# Altium footprint library 7-Connectors-13.PcbLib: 44 footprints (part 3 of 5)
Each footprint in its own frame and in the unit in brackets; x right, y up, seen from the top. Pads: shape width x height; smd on the part's side, far side on the other; paste and mask are expansions set on the pad; w line width, h text height; cw(c..) or ccw(c..) is an arc to the next point about the centre after c.
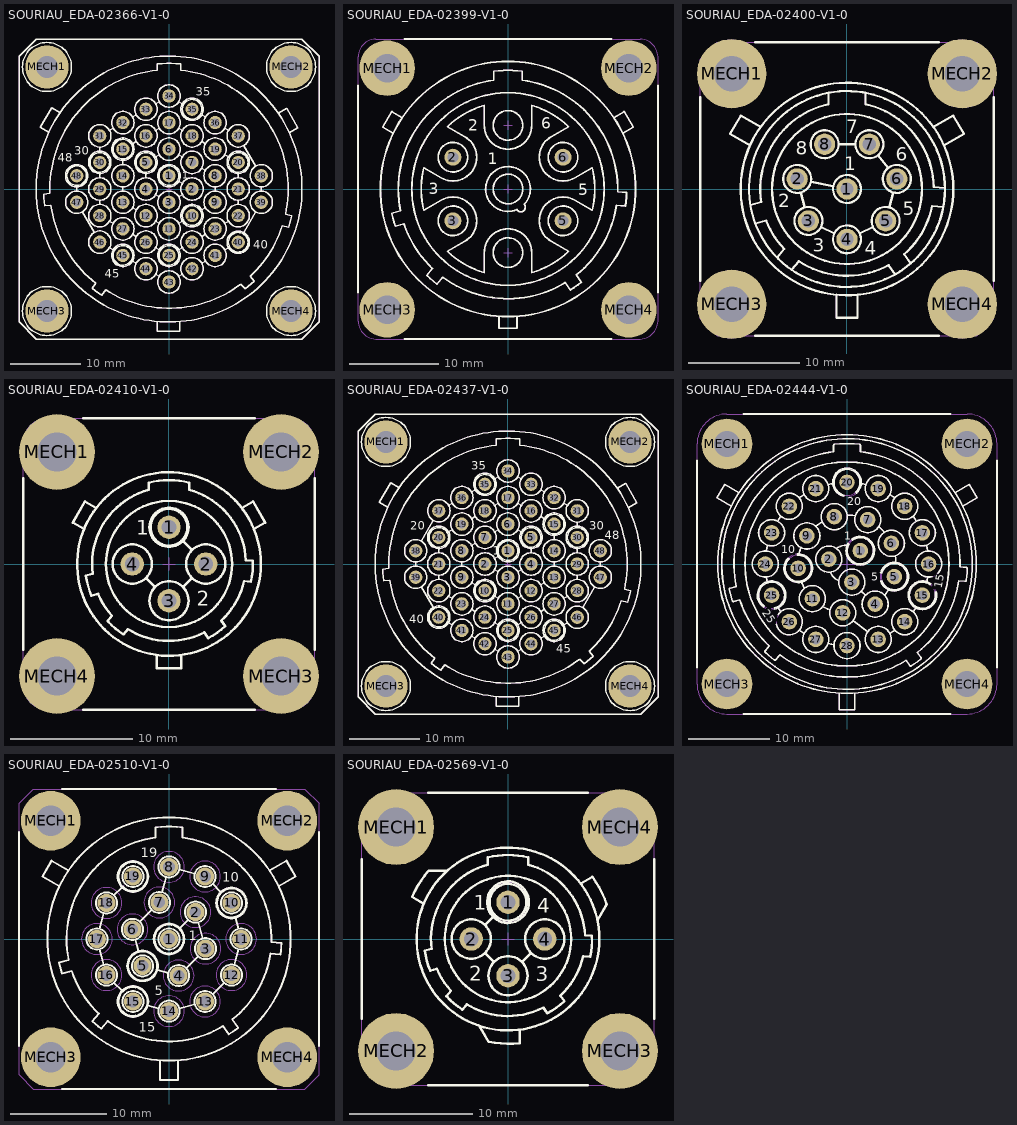
[diagram p2: the footprints below, top view; thin cyan lines are the x and y axes]

## SOURIAU_EDA-02366-V1-0 [mm] "Adapter Kit For PCB Mount For SOURIAU UTO02448P21T, 48 Poles, Shell Size 24, UT Bantam Circular Male Connector. UTO Series"
height 37.7
pads (52):
  round 1.9 hole 1.2: 1(0,1.9) 2(3.3,0) 3(0,-1.9) 4(-3.3,0) 5(-3.3,3.8) 6(0,5.7) 7(3.3,3.8) 8(6.6,1.9) 9(6.6,-1.9) 10(3.3,-3.8) 11(0,-5.7) 12(-3.3,-3.8) 13(-6.6,-1.9) 14(-6.6,1.883) 15(-6.6,5.7) 16(-3.3,7.6) 17(0,9.5) 18(3.3,7.6) 19(6.6,5.7) 20(9.9,3.8) 21(9.9,0) 22(9.9,-3.8) 23(6.6,-5.7) 24(3.3,-7.6) 25(0,-9.5) 26(-3.3,-7.6) 27(-6.6,-5.7) 28(-9.9,-3.8) 29(-9.9,0) 30(-9.9,3.8) 31(-9.9,7.6) 32(-6.6,9.5) 33(-3.3,11.4) 34(0,13.3) 35(3.3,11.4) 36(6.6,9.5) 37(9.9,7.6) 38(13.2,1.9) 39(13.2,-1.9) 40(9.9,-7.617) 41(6.6,-9.5) 42(3.3,-11.4) 43(0,-13.3) 44(-3.3,-11.4) 45(-6.6,-9.5) 46(-9.9,-7.6) 47(-13.2,-1.9) 48(-13.2,1.9)
  round 6.2 hole 3.2: MECH1(-17.45,17.45) MECH2(17.45,17.45) MECH3(-17.45,-17.45) MECH4(17.45,-17.45)
Top Overlay:
  circle w0.2: c6.6,9.5 r1.6
  circle w0.2: c9.9,7.6 r1.6
  circle w0.2: c6.6,5.7 r1.6
  circle w0.2: c3.3,7.6 r1.6
  circle w0.2: c0,9.5 r1.6
  circle w0.2: c0,13.3 r1.6
  circle w0.2: c-3.3,11.4 r1.6
  circle w0.2: c-6.6,9.5 r1.6
  circle w0.2: c-3.3,7.6 r1.6
  circle w0.2: c0,5.7 r1.6
  circle w0.2: c3.3,3.8 r1.6
  circle w0.2: c13.2,1.9 r1.6
  circle w0.2: c9.9,0 r1.6
  circle w0.2: c6.6,1.9 r1.6
  circle w0.2: c13.2,-1.9 r1.6
  circle w0.2: c9.9,-3.8 r1.6
  circle w0.2: c6.6,-1.9 r1.6
  circle w0.2: c6.6,-5.7 r1.6
  circle w0.2: c6.6,-9.5 r1.6
  circle w0.2: c3.3,-7.6 r1.6
  circle w0.2: c0,-5.7 r1.6
  circle w0.2: c0,-1.9 r1.6
  circle w0.2: c3.3,0 r1.6
  circle w0.2: c-3.3,0 r1.6
  circle w0.2: c-9.9,7.6 r1.6
  circle w0.2: c-9.9,0 r1.6
  circle w0.2: c-6.6,1.883 r1.6
  circle w0.2: c-6.6,-1.9 r1.6
  circle w0.2: c-13.2,-1.9 r1.6
  circle w0.2: c-9.9,-3.8 r1.6
  circle w0.2: c-6.6,-5.7 r1.6
  circle w0.2: c-3.3,-3.8 r1.6
  circle w0.2: c-3.3,-7.6 r1.6
  circle w0.2: c0,-13.3 r1.6
  circle w0.2: c3.3,-11.4 r1.6
  circle w0.2: c-3.3,-11.4 r1.6
  circle w0.2: c-9.9,-7.6 r1.6
  circle w0.2: c-3.3,3.8 r1.4
  circle w0.2: c0,0 r19.015
  circle w0.2: c-17.45,17.45 r3.5
  circle w0.2: c17.45,17.45 r3.5
  circle w0.2: c17.45,-17.45 r3.5
  circle w0.2: c-17.45,-17.45 r3.5
  circle w0.2: c3.3,11.4 r1.6
  circle w0.2: c9.9,3.8 r1.6
  circle w0.2: c9.9,-7.617 r1.6
  circle w0.2: c3.3,-3.8 r1.6
  circle w0.2: c0,1.9 r1.6
  circle w0.2: c-3.3,3.8 r1.6
  circle w0.2: c-6.6,5.7 r1.6
  circle w0.2: c-9.9,3.8 r1.6
  circle w0.2: c-13.2,1.9 r1.6
  circle w0.2: c0,-9.5 r1.6
  circle w0.2: c-6.6,-9.5 r1.6
  circle w0.2: c-6.6,5.7 r1.4
  circle w0.2: c-9.9,3.8 r1.4
  circle w0.2: c-13.2,1.9 r1.4
  circle w0.2: c0,1.9 r1.4
  circle w0.2: c3.3,-3.8 r1.4
  circle w0.2: c9.9,-7.617 r1.4
  circle w0.2: c9.9,3.8 r1.4
  circle w0.2: c3.3,11.4 r1.4
  circle w0.2: c0,-9.5 r1.4
  circle w0.2: c-6.6,-9.5 r1.4
  lines w0.2: -17.187,8.134 -18.394,8.831 -16.794,11.602 -15.58,10.901 ; -13.2,-0.3 -13.2,0.3 ; -12.398,-3.285 -10.702,-6.215 ; -9.9,-2.2 -9.9,-1.6 ; -9.9,1.6 -9.9,2.2 ; -9.9,5.4 -9.9,6 ; -8.513,-8.398 -7.987,-8.702 ; -8.513,-4.598 -7.987,-4.902 ; -8.513,8.398 -7.987,8.702 ; -6.6,-0.3 -6.6,0.283 ; -6.6,3.483 -6.6,4.1 ; -5.213,-10.298 -4.687,-10.602 ; -5.213,-6.498 -4.687,-6.802 ; -5.213,-2.698 -4.687,-3.002 ; -5.213,6.498 -4.687,6.802 ; -5.213,10.298 -4.687,10.602 ; -3.3,1.6 -3.3,2.2 ; -1.913,-12.198 -1.387,-12.502 ; -1.913,-8.398 -1.387,-8.702 ; -1.913,-4.598 -1.387,-4.902 ; -1.913,-0.798 -1.387,-1.102 ; -1.913,4.598 -1.387,4.902 ; -1.913,8.398 -1.387,8.702 ; -1.913,12.198 -1.387,12.502 ; -1.651,-18.943 -1.651,-20.345 1.549,-20.345 1.549,-18.952 ; 1.387,-12.502 1.913,-12.198 ; 1.387,-8.702 1.913,-8.398 ; 1.387,-4.902 1.913,-4.598 ; 1.387,-1.102 1.913,-0.798 ; 1.387,1.102 1.913,0.798 ; 1.387,4.902 1.913,4.598 ; 1.387,8.702 1.913,8.398 ; 1.387,12.502 1.913,12.198 ; 4.687,-10.602 5.213,-10.298 ; 4.687,-6.802 5.213,-6.498 ; 4.687,-3.002 5.213,-2.698 ; 4.687,3.002 5.213,2.698 ; 4.687,6.802 5.213,6.498 ; 4.687,10.602 5.213,10.298 ; 6.6,-0.3 6.6,0.3 ; 7.987,-4.902 8.513,-4.598 ; 7.987,4.902 8.513,4.598 ; 7.987,8.702 8.513,8.398 ; 7.99,-8.707 8.51,-8.41 ; 9.9,-2.2 9.9,-1.6 ; 9.9,1.6 9.9,2.2 ; 10.7,-6.231 12.4,-3.286 ; 10.702,6.215 12.398,3.285 ; 13.2,-0.3 13.2,0.3 ; 15.638,10.818 16.845,11.514 18.445,8.743 17.231,8.042 ; -21.45,-18.95 -18.95,-21.45 18.95,-21.45 21.45,-18.95 21.45,18.95 18.95,21.45 -18.95,21.45 -21.45,18.95 -21.45,-18.95 ; -17.946,-0.719 ccw(c0,0) -17.798,-2.41 -16.885,-2.33 ccw(c0,0) -10.461,-13.458 -10.986,-14.208 ccw(c0,0) -9.594,-15.183 -9.068,-14.433 ccw(c0,0) 10.292,-13.587 10.88,-14.289 ccw(c0,0) 12.183,-13.196 11.594,-12.495 ccw(c0,0) 16.224,-5.227 17.109,-5.464 ccw(c0,0) 17.549,-3.822 16.664,-3.585 ccw(c0,0) 1.65,16.965 1.65,17.884 ccw(c0,0) -1.65,17.884 -1.65,16.965 ccw(c0,0) -17.033,-0.637 -17.946,-0.719
  text "45" at -9.186,-12.664 h1.2
  text "40" at 12.075,-8.522 h1.2
  text "35" at 3.817,13.325 h1.2
  text "1" at 1.875,1.45 h1
  text "30" at -13.527,4.91 h1.2
  text "48" at -15.88,3.889 h1.2
Mechanical 8:
  drawing of 212 lines, arcs and shapes, not listed
Mechanical 14:
  circle w0.1: c0,0 r19.015
  circle w0.1: c-17.45,17.45 r2.75
  circle w0.1: c17.45,17.45 r2.75
  circle w0.1: c17.45,-17.45 r2.75
  circle w0.1: c-17.45,-17.45 r2.75
  circle w0.1: c3.3,11.4 r1.6
  circle w0.1: c6.6,9.5 r1.6
  circle w0.1: c9.9,7.6 r1.6
  circle w0.1: c6.6,5.7 r1.6
  circle w0.1: c3.3,7.6 r1.6
  circle w0.1: c0,9.5 r1.6
  circle w0.1: c0,13.3 r1.6
  circle w0.1: c-3.3,11.4 r1.6
  circle w0.1: c-6.6,9.5 r1.6
  circle w0.1: c-3.3,7.6 r1.6
  circle w0.1: c0,5.7 r1.6
  circle w0.1: c3.3,3.8 r1.6
  circle w0.1: c9.9,3.8 r1.6
  circle w0.1: c13.2,1.9 r1.6
  circle w0.1: c9.9,0 r1.6
  circle w0.1: c6.6,1.9 r1.6
  circle w0.1: c13.2,-1.9 r1.6
  circle w0.1: c9.9,-3.8 r1.6
  circle w0.1: c6.6,-1.9 r1.6
  circle w0.1: c6.6,-5.7 r1.6
  circle w0.1: c9.9,-7.617 r1.6
  circle w0.1: c6.6,-9.5 r1.6
  circle w0.1: c3.3,-7.6 r1.6
  circle w0.1: c0,-5.7 r1.6
  circle w0.1: c3.3,-3.8 r1.6
  circle w0.1: c0,-1.9 r1.6
  circle w0.1: c0,1.9 r1.6
  circle w0.1: c3.3,0 r1.6
  circle w0.1: c-3.3,0 r1.6
  circle w0.1: c-3.3,3.8 r1.6
  circle w0.1: c-6.6,5.7 r1.6
  circle w0.1: c-9.9,7.6 r1.6
  circle w0.1: c-9.9,3.8 r1.6
  circle w0.1: c-13.2,1.9 r1.6
  circle w0.1: c-9.9,0 r1.6
  circle w0.1: c-6.6,1.883 r1.6
  circle w0.1: c-6.6,-1.9 r1.6
  circle w0.1: c-13.2,-1.9 r1.6
  circle w0.1: c-9.9,-3.8 r1.6
  circle w0.1: c-6.6,-5.7 r1.6
  circle w0.1: c-3.3,-3.8 r1.6
  circle w0.1: c-3.3,-7.6 r1.6
  circle w0.1: c0,-9.5 r1.6
  circle w0.1: c0,-13.3 r1.6
  circle w0.1: c3.3,-11.4 r1.6
  circle w0.1: c-3.3,-11.4 r1.6
  circle w0.1: c-6.6,-9.5 r1.6
  circle w0.1: c-9.9,-7.6 r1.6
  lines w0.1: -17.187,8.134 -18.394,8.831 -16.794,11.602 -15.58,10.901 ; -13.2,-0.3 -13.2,0.3 ; -12.398,-3.285 -10.702,-6.215 ; -9.9,-2.2 -9.9,-1.6 ; -9.9,1.6 -9.9,2.2 ; -9.9,5.4 -9.9,6 ; -8.513,-8.398 -7.987,-8.702 ; -8.513,-4.598 -7.987,-4.902 ; -8.513,8.398 -7.987,8.702 ; -6.6,-0.3 -6.6,0.283 ; -6.6,3.483 -6.6,4.1 ; -5.213,-10.298 -4.687,-10.602 ; -5.213,-6.498 -4.687,-6.802 ; -5.213,-2.698 -4.687,-3.002 ; -5.213,6.498 -4.687,6.802 ; -5.213,10.298 -4.687,10.602 ; -3.3,1.6 -3.3,2.2 ; -1.913,-12.198 -1.387,-12.502 ; -1.913,-8.398 -1.387,-8.702 ; -1.913,-4.598 -1.387,-4.902 ; -1.913,-0.798 -1.387,-1.102 ; -1.913,4.598 -1.387,4.902 ; -1.913,8.398 -1.387,8.702 ; -1.913,12.198 -1.387,12.502 ; -1.651,-18.943 -1.651,-20.345 1.549,-20.345 1.549,-18.952 ; 1.387,-12.502 1.913,-12.198 ; 1.387,-8.702 1.913,-8.398 ; 1.387,-4.902 1.913,-4.598 ; 1.387,-1.102 1.913,-0.798 ; 1.387,1.102 1.913,0.798 ; 1.387,4.902 1.913,4.598 ; 1.387,8.702 1.913,8.398 ; 1.387,12.502 1.913,12.198 ; 4.687,-10.602 5.213,-10.298 ; 4.687,-6.802 5.213,-6.498 ; 4.687,-3.002 5.213,-2.698 ; 4.687,3.002 5.213,2.698 ; 4.687,6.802 5.213,6.498 ; 4.687,10.602 5.213,10.298 ; 6.6,-0.3 6.6,0.3 ; 7.987,-4.902 8.513,-4.598 ; 7.987,4.902 8.513,4.598 ; 7.987,8.702 8.513,8.398 ; 7.99,-8.707 8.51,-8.41 ; 9.9,-2.2 9.9,-1.6 ; 9.9,1.6 9.9,2.2 ; 10.7,-6.231 12.4,-3.286 ; 10.702,6.215 12.398,3.285 ; 13.2,-0.3 13.2,0.3 ; 15.638,10.818 16.845,11.514 18.445,8.743 17.231,8.042 ; -21.45,-18.95 -18.95,-21.45 18.95,-21.45 21.45,-18.95 21.45,18.95 18.95,21.45 -18.95,21.45 -21.45,18.95 -21.45,-18.95 ; -17.946,-0.719 ccw(c0,0) -17.798,-2.41 -16.885,-2.33 ccw(c0,0) -10.461,-13.458 -10.986,-14.208 ccw(c0,0) -9.594,-15.183 -9.068,-14.433 ccw(c0,0) 10.292,-13.587 10.88,-14.289 ccw(c0,0) 12.183,-13.196 11.594,-12.495 ccw(c0,0) 16.224,-5.227 17.109,-5.464 ccw(c0,0) 17.549,-3.822 16.664,-3.585 ccw(c0,0) 1.65,16.965 1.65,17.884 ccw(c0,0) -1.65,17.884 -1.65,16.965 ccw(c0,0) -17.033,-0.637 -17.946,-0.719
  text "45" at -7.571,-10.1 h1.2
  text "40" at 8.929,-8.217 h1.2
  text "35" at 2.329,10.8 h1.2
  text "25" at -0.971,-10.1 h1.2
  text "20" at 8.929,3.2 h1.2
  text "15" at -7.457,5.1 h1.2
  text "10" at 2.443,-4.4 h1.2
  text "5" at -3.7,3.2 h1.2
  text "1" at -0.143,1.3 h1.2
  text "30" at -10.871,3.2 h1.2
  text "48" at -14.171,1.3 h1.2
3D body "EDA-02366-V1-0.stp": height 37.7, standoff -11.1, extent -21.45,-21.45 21.45,21.45

## SOURIAU_EDA-02399-V1-0 [mm] "Adapter Kit For PCB Mount For SOURIAU UTG0187SVDEX, 8 Poles,VDE  Metalok Bantam Circular Female Connecteur"
height 40.45
pads (8):
  round 1.9 hole 1.2: 2(-6.149,3.55) 3(-6.149,-3.55) 5(6.149,-3.55) 6(6.149,3.55)
  round 6.2 hole 3.2: MECH1(-13.5,13.5) MECH2(13.5,13.5) MECH3(-13.5,-13.5) MECH4(13.5,-13.5)
Top Overlay:
  circle w0.2: c0,0 r14.25
  circle w0.2: c0,0 r10.75
  circle w0.2: c6.149,-3.55 r1.65
  circle w0.2: c0,-7.1 r1.65
  circle w0.2: c-6.149,-3.55 r1.65
  circle w0.2: c0,0 r1.65
  circle w0.2: c-6.149,3.55 r1.65
  circle w0.2: c0,7.1 r1.65
  circle w0.2: c6.149,3.55 r1.65
  lines w0.2: -16.75,-11.594 -16.75,11.594 ; -12.81,6.241 -13.967,6.909 -12.967,8.641 -11.81,7.973 ; -11.594,-16.75 11.594,-16.75 ; -11.594,16.75 11.594,16.75 ; -1,-14.215 -1,-15.55 1,-15.55 1,-14.215 ; 11.81,7.973 12.967,8.641 13.967,6.909 12.81,6.241 ; 16.75,-11.594 16.75,11.594 ; -12.972,-2.699 ccw(c0,0) -12.584,-4.148 -11.616,-3.889 ccw(c0,0) -8.434,-8.884 -9.078,-9.652 ccw(c0,0) -7.929,-10.616 -7.285,-9.849 ccw(c0,0) 6.399,-10.446 6.973,-11.267 ccw(c0,0) 8.202,-10.406 7.627,-9.586 ccw(c0,0) 12.115,-1.813 13.113,-1.9 ccw(c0,0) 13.244,-0.406 12.246,-0.319 ccw(c0,0) 1.6,12.145 1.6,13.153 ccw(c0,0) -1.6,13.153 -1.6,12.145 ccw(c0,0) -12.005,-2.44 -12.972,-2.699 ; -9.406,-2.371 cw(c0,0) -9.406,2.371 -7.474,1.255 ccw(c-6.149,3.55) -4.824,5.845 -6.756,6.96 cw(c0,0) -2.65,9.331 -2.65,7.1 ccw(c0,7.1) 2.65,7.1 2.65,9.331 cw(c0,0) 6.756,6.96 4.824,5.845 ccw(c6.149,3.55) 7.474,1.255 9.406,2.371 cw(c0,0) 9.406,-2.371 7.474,-1.255 ccw(c6.149,-3.55) 4.824,-5.845 6.756,-6.96 cw(c0,0) 2.65,-9.331 2.65,-7.1 ccw(c0,-7.1) -2.65,-7.1 -2.65,-9.331 cw(c0,0) -6.756,-6.96 -4.824,-5.845 ccw(c-6.149,-3.55) -7.474,-1.255 -9.406,-2.371 ; 0.998,-2.292 cw(c0,0) 1.813,-1.722 cw(c1.434,-2.048) 0.998,-2.292
  text "6" at 3.709,6.718 h1.25
  text "5" at 7.859,-0.682 h1.25
  text "3" at -8.841,-0.582 h1.25
  text "2" at -4.416,6.518 h1.25
  text "1" at -2.242,2.768 h1.25
Mechanical 8:
  lines w0.1: -14,-13.5 -13.5,-13.5 ; -14,13.5 -13.5,13.5 ; -13.5,-14 -13.5,-13.5 ; -13.5,-13 -13.5,-13.5 ; -13.5,13 -13.5,13.5 ; -13.5,14 -13.5,13.5 ; -13,-13.5 -13.5,-13.5 ; -13,13.5 -13.5,13.5 ; -6.582,-3.8 -6.149,-3.55 ; -6.582,3.8 -6.149,3.55 ; -6.399,-3.117 -6.149,-3.55 ; -6.399,3.117 -6.149,3.55 ; -5.899,-3.983 -6.149,-3.55 ; -5.899,3.983 -6.149,3.55 ; -5.716,-3.3 -6.149,-3.55 ; -5.716,3.3 -6.149,3.55 ; -0.5,-7.1 0,-7.1 ; -0.5,0 0,0 ; -0.5,7.1 0,7.1 ; 0,-7.6 0,-7.1 ; 0,-6.6 0,-7.1 ; 0,-0.5 0,0 ; 0,0.5 0,0 ; 0,6.6 0,7.1 ; 0,7.6 0,7.1 ; 0.5,-7.1 0,-7.1 ; 0.5,0 0,0 ; 0.5,7.1 0,7.1 ; 5.716,-3.3 6.149,-3.55 ; 5.716,3.3 6.149,3.55 ; 5.899,-3.983 6.149,-3.55 ; 5.899,3.983 6.149,3.55 ; 6.399,-3.117 6.149,-3.55 ; 6.399,3.117 6.149,3.55 ; 6.582,-3.8 6.149,-3.55 ; 6.582,3.8 6.149,3.55 ; 13,-13.5 13.5,-13.5 ; 13,13.5 13.5,13.5 ; 13.5,-14 13.5,-13.5 ; 13.5,-13 13.5,-13.5 ; 13.5,13 13.5,13.5 ; 13.5,14 13.5,13.5 ; 14,-13.5 13.5,-13.5 ; 14,13.5 13.5,13.5
Mechanical 14:
  circle w0.1: c6.149,-3.55 r1.65
  circle w0.1: c6.149,3.55 r1.65
  circle w0.1: c0,-7.1 r1.65
  circle w0.1: c-6.149,-3.55 r1.65
  circle w0.1: c-6.149,3.55 r1.65
  circle w0.1: c0,7.1 r1.65
  circle w0.1: c-13.5,-13.5 r1.6
  circle w0.1: c13.5,-13.5 r1.6
  circle w0.1: c13.5,13.5 r1.6
  circle w0.1: c-13.5,13.5 r1.6
  circle w0.1: c0,0 r1.65
  circle w0.1: c0,0 r10.75
  circle w0.1: c0,0 r14.25
  lines w0.1: -12.81,6.241 -13.967,6.909 -12.967,8.641 -11.81,7.973 ; -1,-14.215 -1,-15.55 1,-15.55 1,-14.215 ; 11.81,7.973 12.967,8.641 13.967,6.909 12.81,6.241 ; -16.75,-14.75 ccw(c-14.75,-14.75) -14.75,-16.75 14.75,-16.75 ccw(c14.75,-14.75) 16.75,-14.75 16.75,14.75 ccw(c14.75,14.75) 14.75,16.75 -14.75,16.75 ccw(c-14.75,14.75) -16.75,14.75 -16.75,-14.75 ; -12.972,-2.699 ccw(c0,0) -12.584,-4.148 -11.616,-3.889 ccw(c0,0) -8.434,-8.884 -9.078,-9.652 ccw(c0,0) -7.929,-10.616 -7.285,-9.849 ccw(c0,0) 6.399,-10.446 6.973,-11.267 ccw(c0,0) 8.202,-10.406 7.627,-9.586 ccw(c0,0) 12.115,-1.813 13.113,-1.9 ccw(c0,0) 13.244,-0.406 12.246,-0.319 ccw(c0,0) 1.6,12.145 1.6,13.153 ccw(c0,0) -1.6,13.153 -1.6,12.145 ccw(c0,0) -12.005,-2.44 -12.972,-2.699 ; -9.406,-2.371 cw(c0,0) -9.406,2.371 -7.474,1.255 ccw(c-6.149,3.55) -4.824,5.845 -6.756,6.96 cw(c0,0) -2.65,9.331 -2.65,7.1 ccw(c0,7.1) 2.65,7.1 2.65,9.331 cw(c0,0) 6.756,6.96 4.824,5.845 ccw(c6.149,3.55) 7.474,1.255 9.406,2.371 cw(c0,0) 9.406,-2.371 7.474,-1.255 ccw(c6.149,-3.55) 4.824,-5.845 6.756,-6.96 cw(c0,0) 2.65,-9.331 2.65,-7.1 ccw(c0,-7.1) -2.65,-7.1 -2.65,-9.331 cw(c0,0) -6.756,-6.96 -4.824,-5.845 ccw(c-6.149,-3.55) -7.474,-1.255 -9.406,-2.371 ; 0.998,-2.292 ccw(c1.434,-2.048) 1.813,-1.722 ccw(c0,0) 0.998,-2.292
  text "2" at -6.815,2.55 h2
  text "3" at -6.815,-4.55 h2
  text "5" at 5.482,-4.55 h2
  text "6" at 5.53,2.55 h2
  text "X" at -0.667,-1 h2
  text "X" at -0.667,6.1 h2
  text "X" at -0.667,-8.1 h2
3D body "EDA-02399-V1-0.stp": height 40.3, standoff -5.89, extent -16.75,-16.75 16.75,16.75

## SOURIAU_EDA-02400-V1-0 [mm] "Adapter Kit For PCB Mount For SOURIAU UTG0128S03, 8 Poles, Shell Size 12, Metalok Bantam Circular Female Connecteur"
height 33.95
pads (12):
  round 1.9 hole 1.2: 1(0,0) 2(-4.45,0.9) 3(-3.45,-2.85) 4(0,-4.5) 5(3.45,-2.85) 6(4.45,0.9) 7(2,4) 8(-2,4)
  round 6.2 hole 3.2: MECH1(-10.3,10.3) MECH2(10.3,10.3) MECH3(-10.3,-10.3) MECH4(10.3,-10.3)
Top Overlay:
  circle w0.2: c0,0 r9.5
  circle w0.2: c0,0 r9.5
  circle w0.2: c0,0 r6.7
  circle w0.2: c0,0 r8.75
  circle w0.2: c-4.45,0.9 r1.25
  circle w0.2: c-2,4 r1.25
  circle w0.2: c2,4 r1.25
  circle w0.2: c4.45,0.9 r1.25
  circle w0.2: c3.45,-2.85 r1.25
  circle w0.2: c0,-4.5 r1.25
  circle w0.2: c-3.45,-2.85 r1.25
  circle w0.2: c0,0 r1.25
  lines w0.2: -13.1,-8.2 -13.1,8.2 ; -8.659,3.908 -10.432,4.932 -9.487,6.568 -7.714,5.545 ; -8.632,-1.433 -7.661,-1.173 cw(c0,0) -1.65,7.572 -1.65,8.593 ; -8.2,-13.1 8.2,-13.1 ; -8.2,13.1 8.2,13.1 ; -8.192,-3.075 -7.221,-2.815 ccw(c0,0) -5.603,-5.355 -6.249,-6.125 ; -4.947,-7.218 -4.3,-6.447 ccw(c0,0) 3.722,-6.798 4.299,-7.621 ; -4.128,-0.308 -3.772,-1.642 ; -3.225,0.652 -1.225,0.248 ; -2.322,-3.389 -1.128,-3.961 ; -0.945,-9.453 -0.945,-11.5 0.945,-11.5 0.945,-9.453 ; -0.75,4 0.75,4 ; 1.128,-3.961 2.322,-3.389 ; 1.65,8.593 1.65,7.572 cw(c0,0) 7.748,0.175 8.75,0.088 ; 2.775,3.019 3.675,1.881 ; 3.772,-1.642 4.128,-0.308 ; 5.691,-6.646 5.115,-5.823 ccw(c0,0) 7.6,-1.518 8.601,-1.606 ; 7.714,5.545 9.487,6.568 10.432,4.932 8.659,3.908 ; 13.1,-8.2 13.1,8.2
  text "8" at -4.567,3.068 h1.2
  text "2" at -6.12,-1.647 h1.2
  text "3" at -3.06,-5.606 h1.2
  text "6" at 4.334,2.523 h1.2
  text "5" at 4.976,-2.332 h1.2
  text "4" at 1.569,-5.883 h1.2
  text "7" at -0.083,5.001 h1.2
  text "1" at -0.243,1.685 h1.2
Mechanical 8:
  lines w0.1: -10.8,-10.3 -10.3,-10.3 ; -10.8,10.3 -10.3,10.3 ; -10.3,-10.8 -10.3,-10.3 ; -10.3,-9.8 -10.3,-10.3 ; -10.3,9.8 -10.3,10.3 ; -10.3,10.8 -10.3,10.3 ; -9.8,-10.3 -10.3,-10.3 ; -9.8,10.3 -10.3,10.3 ; -4.95,0.9 -4.45,0.9 ; -4.45,0.4 -4.45,0.9 ; -4.45,1.4 -4.45,0.9 ; -3.95,-2.85 -3.45,-2.85 ; -3.95,0.9 -4.45,0.9 ; -3.45,-3.35 -3.45,-2.85 ; -3.45,-2.35 -3.45,-2.85 ; -2.95,-2.85 -3.45,-2.85 ; -2.5,4 -2,4 ; -2,3.5 -2,4 ; -2,4.5 -2,4 ; -1.5,4 -2,4 ; -0.5,-4.5 0,-4.5 ; -0.5,0 0,0 ; 0,-5 0,-4.5 ; 0,-4 0,-4.5 ; 0,-0.5 0,0 ; 0,0.5 0,0 ; 0.5,-4.5 0,-4.5 ; 0.5,0 0,0 ; 1.5,4 2,4 ; 2,3.5 2,4 ; 2,4.5 2,4 ; 2.5,4 2,4 ; 2.95,-2.85 3.45,-2.85 ; 3.45,-3.35 3.45,-2.85 ; 3.45,-2.35 3.45,-2.85 ; 3.95,-2.85 3.45,-2.85 ; 3.95,0.9 4.45,0.9 ; 4.45,0.4 4.45,0.9 ; 4.45,1.4 4.45,0.9 ; 4.95,0.9 4.45,0.9 ; 9.8,-10.3 10.3,-10.3 ; 9.8,10.3 10.3,10.3 ; 10.3,-10.8 10.3,-10.3 ; 10.3,-9.8 10.3,-10.3 ; 10.3,9.8 10.3,10.3 ; 10.3,10.8 10.3,10.3 ; 10.8,-10.3 10.3,-10.3 ; 10.8,10.3 10.3,10.3
Mechanical 14:
  circle w0.1: c0,0 r9.5
  circle w0.1: c-10.3,-10.3 r3
  circle w0.1: c-10.3,10.3 r3
  circle w0.1: c10.3,-10.3 r3
  circle w0.1: c10.3,10.3 r3
  circle w0.1: c0,0 r9.5
  circle w0.1: c0,0 r6.7
  circle w0.1: c0,0 r8.75
  circle w0.1: c-4.45,0.9 r1.25
  circle w0.1: c-2,4 r1.25
  circle w0.1: c2,4 r1.25
  circle w0.1: c4.45,0.9 r1.25
  circle w0.1: c3.45,-2.85 r1.25
  circle w0.1: c0,-4.5 r1.25
  circle w0.1: c-3.45,-2.85 r1.25
  circle w0.1: c0,0 r1.25
  lines w0.1: -8.659,3.908 -10.432,4.932 -9.487,6.568 -7.714,5.545 ; -8.632,-1.433 -7.661,-1.173 cw(c0,0) -1.65,7.572 -1.65,8.593 ; -8.192,-3.075 -7.221,-2.815 ccw(c0,0) -5.603,-5.355 -6.249,-6.125 ; -4.947,-7.218 -4.3,-6.447 ccw(c0,0) 3.722,-6.798 4.299,-7.621 ; -4.128,-0.308 -3.772,-1.642 ; -3.225,0.652 -1.225,0.248 ; -2.322,-3.389 -1.128,-3.961 ; -0.945,-9.453 -0.945,-11.5 0.945,-11.5 0.945,-9.453 ; -0.75,4 0.75,4 ; 1.128,-3.961 2.322,-3.389 ; 1.65,8.593 1.65,7.572 cw(c0,0) 7.748,0.175 8.75,0.088 ; 2.775,3.019 3.675,1.881 ; 3.772,-1.642 4.128,-0.308 ; 5.691,-6.646 5.115,-5.823 ccw(c0,0) 7.6,-1.518 8.601,-1.606 ; 7.714,5.545 9.487,6.568 10.432,4.932 8.659,3.908 ; -13.1,-11.6 -11.6,-13.1 11.6,-13.1 13.1,-11.6 13.1,11.6 11.6,13.1 -11.6,13.1 -13.1,11.6 -13.1,-11.6
  text "8" at -4.567,3.068 h1.2
  text "2" at -6.12,-1.647 h1.2
  text "3" at -3.06,-5.606 h1.2
  text "6" at 4.334,2.523 h1.2
  text "5" at 4.976,-2.332 h1.2
  text "4" at 1.569,-5.883 h1.2
  text "7" at -0.083,5.001 h1.2
  text "1" at -0.243,1.685 h1.2
3D body "EDA-02400-V1-0.stp": height 33.7, standoff -6.3, extent -13.4,-13.4 13.399,13.4

## SOURIAU_EDA-02410-V1-0 [mm] "Adapter Kit For PCB Mount For SOURIAU UTO0104P21T, 4 Poles, Shell Size 10, UT Bantam Circular Male Connector. UTO Series"
height 33.3
pads (8):
  round 1.9 hole 1.2: 1(0,3) 2(3,0) 3(0,-3) 4(-3,0)
  round 6.2 hole 3.2: MECH1(-9.15,9.15) MECH2(9.15,9.15) MECH3(9.15,-9.15) MECH4(-9.15,-9.15)
Top Overlay:
  circle w0.2: c0,3 r1.6
  circle w0.2: c0,3 r1.5
  circle w0.2: c-3,0 r1.6
  circle w0.2: c0,-3 r1.6
  circle w0.2: c3,0 r1.6
  circle w0.2: c0,0 r5.15
  circle w0.2: c0,0 r7.5
  lines w0.2: -11.9,-6.985 -11.9,6.985 ; -6.985,-11.9 6.985,-11.9 ; -6.985,11.9 6.985,11.9 ; -6.937,2.85 -7.861,3.384 -6.861,5.116 -5.937,4.583 ; -1.869,-1.131 -1.131,-1.869 ; -1,-7.433 -1,-8.5 1,-8.5 1,-7.433 ; 1.131,-1.869 1.869,-1.131 ; 1.131,1.869 1.869,1.131 ; 5.937,4.583 6.861,5.116 7.861,3.384 6.937,2.85 ; 11.9,-6.985 11.9,6.985 ; -6.785,-0.938 ccw(c0,0) -6.345,-2.58 -5.795,-2.433 ccw(c0,0) -4.654,-4.224 -5.02,-4.66 ccw(c0,0) -3.718,-5.753 -3.352,-5.317 ccw(c0,0) 2.876,-5.589 3.202,-6.055 ccw(c0,0) 4.595,-5.08 4.268,-4.614 ccw(c0,0) 6.13,-1.39 6.697,-1.439 ccw(c0,0) 6.845,0.254 6.278,0.304 ccw(c0,0) 1.65,6.065 1.65,6.648 ccw(c0,0) -1.65,6.648 -1.65,6.065 ccw(c0,0) -6.235,-0.791 -6.785,-0.938
  text "2" at 2.273,-3.412 h1.2
  text "1" at -2.675,2.4 h1.2
Mechanical 8:
  lines w0.1: -9.65,-9.15 -9.15,-9.15 ; -9.65,9.15 -9.15,9.15 ; -9.15,-9.65 -9.15,-9.15 ; -9.15,-8.65 -9.15,-9.15 ; -9.15,8.65 -9.15,9.15 ; -9.15,9.65 -9.15,9.15 ; -8.65,-9.15 -9.15,-9.15 ; -8.65,9.15 -9.15,9.15 ; -3.5,0 -3,0 ; -3,-0.5 -3,0 ; -3,0.5 -3,0 ; -2.5,0 -3,0 ; -0.5,-3 0,-3 ; -0.5,0 0,0 ; -0.5,3 0,3 ; 0,-3.5 0,-3 ; 0,-2.5 0,-3 ; 0,-0.5 0,0 ; 0,0.5 0,0 ; 0,2.5 0,3 ; 0,3.5 0,3 ; 0.5,-3 0,-3 ; 0.5,0 0,0 ; 0.5,3 0,3 ; 2.5,0 3,0 ; 3,-0.5 3,0 ; 3,0.5 3,0 ; 3.5,0 3,0 ; 8.65,-9.15 9.15,-9.15 ; 8.65,9.15 9.15,9.15 ; 9.15,-9.65 9.15,-9.15 ; 9.15,-8.65 9.15,-9.15 ; 9.15,8.65 9.15,9.15 ; 9.15,9.65 9.15,9.15 ; 9.65,-9.15 9.15,-9.15 ; 9.65,9.15 9.15,9.15
Mechanical 14:
  circle w0.1: c0,3 r1.6
  circle w0.1: c-3,0 r1.6
  circle w0.1: c0,-3 r1.6
  circle w0.1: c3,0 r1.6
  circle w0.1: c0,0 r5.15
  circle w0.1: c-9.15,-9.15 r1.55
  circle w0.1: c-9.15,9.15 r1.55
  circle w0.1: c9.15,9.15 r1.55
  circle w0.1: c9.15,-9.15 r1.55
  circle w0.1: c0,0 r7.5
  lines w0.1: -6.937,2.85 -7.861,3.384 -6.861,5.116 -5.937,4.583 ; -1.869,-1.131 -1.131,-1.869 ; -1,-7.433 -1,-8.5 1,-8.5 1,-7.433 ; 1.131,-1.869 1.869,-1.131 ; 1.131,1.869 1.869,1.131 ; 5.937,4.583 6.861,5.116 7.861,3.384 6.937,2.85 ; -11.9,-9.9 ccw(c-9.9,-9.9) -9.9,-11.9 9.9,-11.9 ccw(c9.9,-9.9) 11.9,-9.9 11.9,9.9 ccw(c9.9,9.9) 9.9,11.9 -9.9,11.9 ccw(c-9.9,9.9) -11.9,9.9 -11.9,-9.9 ; -6.785,-0.938 ccw(c0,0) -6.345,-2.58 -5.795,-2.433 ccw(c0,0) -4.654,-4.224 -5.02,-4.66 ccw(c0,0) -3.718,-5.753 -3.352,-5.317 ccw(c0,0) 2.876,-5.589 3.202,-6.055 ccw(c0,0) 4.595,-5.08 4.268,-4.614 ccw(c0,0) 6.13,-1.39 6.697,-1.439 ccw(c0,0) 6.845,0.254 6.278,0.304 ccw(c0,0) 1.65,6.065 1.65,6.648 ccw(c0,0) -1.65,6.648 -1.65,6.065 ccw(c0,0) -6.235,-0.791 -6.785,-0.938
  text "4" at -3.429,-0.6 h1.2
  text "3" at -0.4,-3.6 h1.2
  text "2" at 2.6,-0.6 h1.2
  text "1" at -0.143,2.4 h1.2
3D body "EDA-02410-V1-0.stp": height 33.3, standoff -14.2, extent -12.25,-12.249 12.25,12.244
